# Altium footprint library SMD Component.PcbLib: 161 footprints (part 4 of 11)
Each footprint in its own frame and in the unit in brackets; x right, y up, seen from the top. Pads: shape width x height; smd on the part's side, far side on the other; paste and mask are expansions set on the pad; w line width, h text height; cw(c..) or ccw(c..) is an arc to the next point about the centre after c.
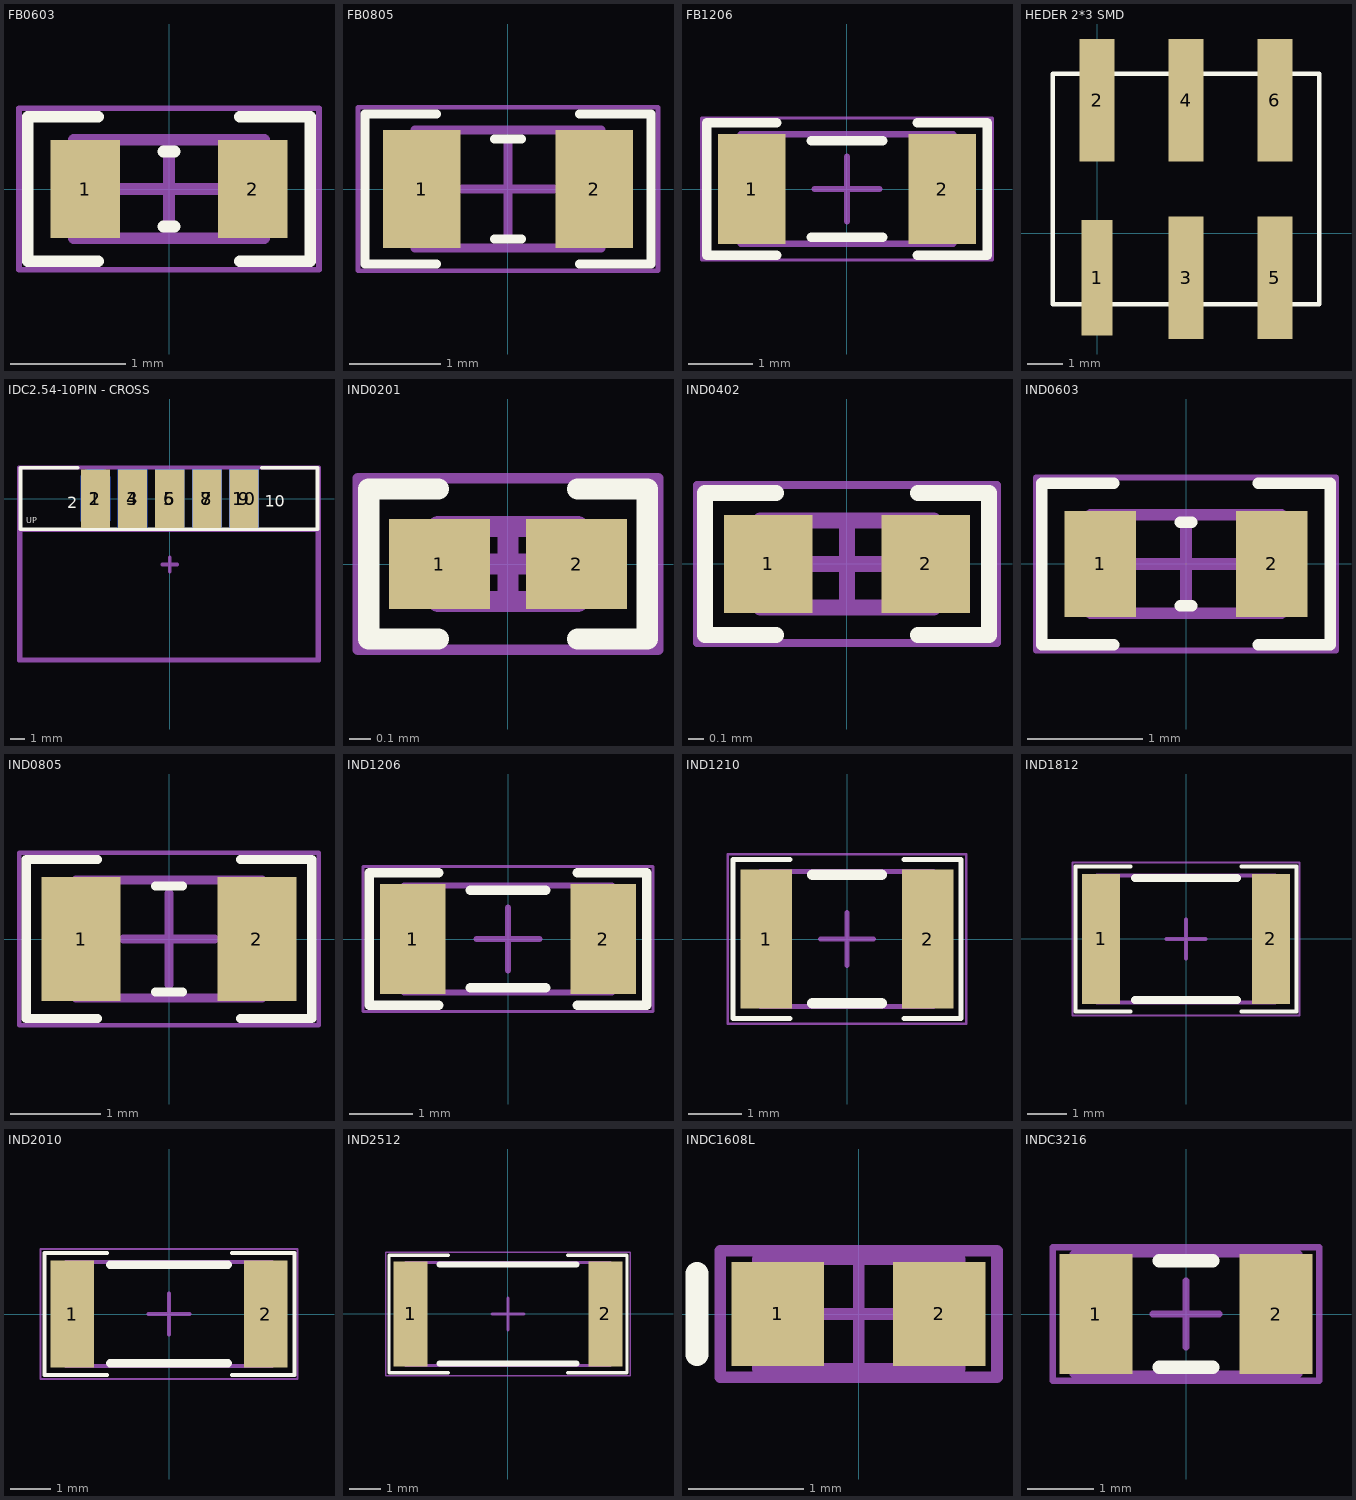
[diagram p3: the footprints below, top view; thin cyan lines are the x and y axes]

## FB0603 [mm] "Ferrite Chip Bead SMD 0603-Design:Ali Hafizi"
pads (2):
  rect 0.6x0.85 smd: 1(-0.725,0) 2(0.725,0)
Top Overlay:
  lines w0.1: -0.613,-0.625 -1.225,-0.625 -1.225,0.625 -0.613,0.625 ; -0.05,-0.325 0.05,-0.325 ; -0.05,0.325 0.05,0.325 ; 0.613,-0.625 1.225,-0.625 1.225,0.625 0.613,0.625
Mechanical 13:
  lines w0.1: -0.825,-0.425 -0.825,0.425 0.825,0.425 0.825,-0.425 -0.825,-0.425
Mechanical 15:
  lines w0.05: -1.3,-0.7 -1.3,0.7 1.3,0.7 1.3,-0.7 -1.3,-0.7
  lines w0.1: -0.425,0 0.425,0 ; 0,-0.425 0,0.425
3D body "User Library-FB_1608-1.STEP": height 0.8, standoff 0, extent -0.81,-0.4 0.79,0.4

## FB0805 [mm] "Ferrite Chip Bead SMD 0805-Design:Ali Hafizi"
pads (2):
  rect 0.85x1.3 smd: 1(-0.95,0) 2(0.95,0)
Top Overlay:
  lines w0.1: -0.787,-0.825 -1.575,-0.825 -1.575,0.825 -0.787,0.825 ; -0.15,-0.55 0.15,-0.55 ; -0.15,0.55 0.15,0.55 ; 0.788,-0.825 1.575,-0.825 1.575,0.825 0.788,0.825
Mechanical 13:
  lines w0.1: -1.025,-0.65 1.025,-0.65 1.025,0.65 -1.025,0.65 -1.025,-0.65
Mechanical 15:
  lines w0.05: -1.65,-0.9 1.65,-0.9 1.65,0.9 -1.65,0.9 -1.65,-0.9
  lines w0.1: -0.5,0 0.5,0 ; 0,-0.5 0,0.5
3D body "User Library-FB_2012-1.STEP": height 0.85, standoff 0, extent -1,-0.63 1,0.62

## FB1206 [mm] "Ferrite Chip Bead SMD 1206-Design:Ali Hafizi"
pads (2):
  rect 1.05x1.7 smd: 1(-1.475,0) 2(1.475,0)
Top Overlay:
  lines w0.15: -1.087,-1.025 -2.175,-1.025 -2.175,1.025 -1.087,1.025 ; -0.55,-0.75 0.55,-0.75 ; -0.55,0.75 0.55,0.75 ; 1.088,-1.025 2.175,-1.025 2.175,1.025 1.088,1.025
Mechanical 13:
  lines w0.1: -1.65,-0.85 -1.65,0.85 1.65,0.85 1.65,-0.85 -1.65,-0.85
Mechanical 15:
  lines w0.05: -2.25,-1.1 -2.25,1.1 2.25,1.1 2.25,-1.1 -2.25,-1.1
  lines w0.1: -0.5,0 0.5,0 ; 0,-0.5 0,0.5
3D body "User Library-ind_1206.step": height 1.1, standoff 0, extent -1.59,-0.8 1.61,0.8

## HEDER 2*3 SMD [mm]
pads (6):
  rect 0.889x3.302 smd: 1(0,-1.27)
  rect 1x3.5 smd: 2(0,3.81) 3(2.54,-1.27) 4(2.54,3.81) 5(5.08,-1.27) 6(5.08,3.81)
Top Overlay:
  lines w0.127: -1.27,-2.032 6.35,-2.032 6.35,4.572 -1.27,4.572 -1.27,-2.032

## IDC2.54-10PIN - CROSS [mm] "Connector; IDC, Low Profile Male Header, Thru-Hole; 10 Position; Vertical; Pitch 2.54 mm; 20.32 x 9.2 x 9.45 mm (LxWxH) DESIGNER : ABBAS BASEREH"
height 9.45
pads (10):
  rrect50% 2x4 smd far side: 1(-5.08,0)
  rect 2x4 smd: 2(-5.08,0) 4(-2.54,0) 6(0,0) 8(2.54,0) 10(5.08,0)
  rect 2x4 smd far side: 3(-2.54,0) 5(0,0) 7(2.54,0) 9(5.08,0)
Top Overlay:
  lines w0.254: -6.3,2.1 -10.2,2.1 -10.2,-2.1 10.1,-2.1 10.1,2.1 6.3,2.1
  text "2" at -7,-0.67 h0.8
  text "10" at 6.5,-0.57 h0.8
  text "UP" at -9.8,-1.7 h0.4
Bottom Overlay:
  text "1" at -6.6,-0.67 h0.8
  text "9" at 7.3,-0.57 h0.8
Mechanical 13:
  lines w0.254: -10.2,-11 10.1,-11 10.1,-2.17 -10.1,-2.17 -10.2,-2.17 -10.2,-11
  text "PCB EDGE" at -9.6,-1.87 h0.4
  text "SOCKET PLACE" at -2.4,-6.6 h0.4
Mechanical 15:
  lines w0.254: -0.5,-4.5 0.5,-4.5 ; 0,-5 0,-4 ; -10.3,-11.07 10.2,-11.07 10.2,2.13 -10.3,2.13 -10.3,-11.07
3D body "User Library-IDC Socket Male 10pin Straight THT Goldplated 2_54mm.STEP": height 4.27, standoff -4.58, extent -10.15,-10.97 10.15,1.43

## IND0201 [mm] "Chip Inductor, 2-Leads, Body 0/60x0/30mm, IPC Medium Density DESIGNER:ABBAS BASEREH"
height 0.23
pads (2):
  rect 0.47x0.42 smd mask+0.04: 1(-0.32,0) 2(0.32,0)
Top Overlay:
  lines w0.1: -0.325,-0.35 -0.65,-0.35 -0.65,0.35 -0.325,0.35 ; 0.325,-0.35 0.65,-0.35 0.65,0.35 0.325,0.35
Mechanical 13:
  lines w0.1: -0.325,-0.175 0.325,-0.175 0.325,0.175 -0.325,0.175 -0.325,-0.175
Mechanical 15:
  lines w0.05: -0.7,-0.4 0.7,-0.4 0.7,0.4 -0.7,0.4 -0.7,-0.4
  lines w0.1: -0.175,0 0.175,0 ; 0,-0.175 0,0.175
3D body "IND0201.step": height 0.23, standoff 0, extent -0.325,-0.175 0.325,0.175

## IND0402 [mm] "Chip Inductor, 2-Leads, Body 1/00x0/50mm, IPC Medium Density DESIGNER:ABBAS BASEREH"
height 0.32
pads (2):
  rect 0.56x0.62 smd mask+0.06: 1(-0.5,0) 2(0.5,0)
Top Overlay:
  lines w0.1: -0.45,-0.45 -0.9,-0.45 -0.9,0.45 -0.45,0.45 ; 0.45,-0.45 0.9,-0.45 0.9,0.45 0.45,0.45
Mechanical 13:
  lines w0.1: -0.55,-0.275 0.55,-0.275 0.55,0.275 -0.55,0.275 -0.55,-0.275
Mechanical 15:
  lines w0.05: -0.95,-0.5 0.95,-0.5 0.95,0.5 -0.95,0.5 -0.95,-0.5
  lines w0.1: -0.275,0 0.275,0 ; 0,-0.275 0,0.275
3D body "IND0402.step": height 0.32, standoff 0, extent -0.55,-0.275 0.55,0.275

## IND0603 [mm] "Chip Inductor, 2-Leads, Body 1/60x0/80mm, IPC Medium Density DESIGNER:ABBAS BASEREH"
height 0.4
pads (2):
  rect 0.62x0.92 smd: 1(-0.745,0) 2(0.745,0)
Top Overlay:
  lines w0.1: -0.625,-0.7 -1.25,-0.7 -1.25,0.7 -0.625,0.7 ; -0.05,-0.36 0.05,-0.36 ; -0.05,0.36 0.05,0.36 ; 0.625,-0.7 1.25,-0.7 1.25,0.7 0.625,0.7
Mechanical 13:
  lines w0.1: -0.825,-0.425 0.825,-0.425 0.825,0.425 -0.825,0.425 -0.825,-0.425
Mechanical 15:
  lines w0.05: -1.3,-0.75 1.3,-0.75 1.3,0.75 -1.3,0.75 -1.3,-0.75
  lines w0.1: -0.425,0 0.425,0 ; 0,-0.425 0,0.425
3D body "IND0603.step": height 0.4, standoff 0, extent -0.825,-0.425 0.825,0.425

## IND0805 [mm] "Chip Inductor, 2-Leads, Body 2/00x1/25mm, IPC Medium Density DESIGNER:ABBAS BASEREH"
height 0.5
pads (2):
  rect 0.87x1.37 smd: 1(-0.97,0) 2(0.97,0)
Top Overlay:
  lines w0.1: -0.788,-0.875 -1.575,-0.875 -1.575,0.875 -0.788,0.875 ; -0.15,-0.585 0.15,-0.585 ; -0.15,0.585 0.15,0.585 ; 0.788,-0.875 1.575,-0.875 1.575,0.875 0.788,0.875
Mechanical 13:
  lines w0.1: -1.025,-0.65 -1.025,0.65 1.025,0.65 1.025,-0.65 -1.025,-0.65
Mechanical 15:
  lines w0.05: -1.65,-0.95 -1.65,0.95 1.65,0.95 1.65,-0.95 -1.65,-0.95
  lines w0.1: -0.5,0 0.5,0 ; 0,-0.5 0,0.5
3D body "IND0805.step": height 0.5, standoff 0, extent -1.025,-0.65 1.025,0.65

## IND1206 [mm] "Chip Inductor, 2-Leads, Body 3/20x1/60mm, IPC Medium Density DESIGNER:ABBAS BASEREH"
height 0.94
pads (2):
  rect 1.04x1.74 smd: 1(-1.51,0) 2(1.51,0)
Top Overlay:
  lines w0.15: -1.1,-1.05 -2.2,-1.05 -2.2,1.05 -1.1,1.05 ; -0.6,-0.77 0.6,-0.77 ; -0.6,0.77 0.6,0.77 ; 1.1,-1.05 2.2,-1.05 2.2,1.05 1.1,1.05
Mechanical 13:
  lines w0.1: -1.65,-0.85 1.65,-0.85 1.65,0.85 -1.65,0.85 -1.65,-0.85
Mechanical 15:
  lines w0.05: -2.3,-1.15 2.3,-1.15 2.3,1.15 -2.3,1.15 -2.3,-1.15
  lines w0.1: -0.5,0 0.5,0 ; 0,-0.5 0,0.5
3D body "IND1206.step": height 0.94, standoff 0, extent -1.65,-0.85 1.65,0.85

## IND1210 [mm] "Chip Inductor, 2-Leads, Body 3/20x2/50mm, IPC Medium Density DESIGNER:ABBAS BASEREH"
height 0.55
pads (2):
  rect 0.97x2.62 smd: 1(-1.52,0) 2(1.52,0)
Top Overlay:
  lines w0.1: -1.075,-1.5 -2.15,-1.5 -2.15,1.5 -1.075,1.5 ; 1.075,-1.5 2.15,-1.5 2.15,1.5 1.075,1.5
  lines w0.2: -0.65,-1.21 0.65,-1.21 ; -0.65,1.21 0.65,1.21
Mechanical 13:
  lines w0.1: -1.625,-1.275 1.625,-1.275 1.625,1.275 -1.625,1.275 -1.625,-1.275
Mechanical 15:
  lines w0.05: -2.25,-1.6 2.25,-1.6 2.25,1.6 -2.25,1.6 -2.25,-1.6
  lines w0.1: -0.5,0 0.5,0 ; 0,-0.5 0,0.5
3D body "IND1210.step": height 0.55, standoff 0, extent -1.625,-1.275 1.625,1.275

## IND1812 [mm] "Chip Inductor, 2-Leads, Body 4/50x3/20mm, IPC Medium Density DESIGNER:ABBAS BASEREH"
height 0.55
pads (2):
  rect 0.97x3.32 smd: 1(-2.17,0) 2(2.17,0)
Top Overlay:
  lines w0.1: -1.413,-1.85 -2.825,-1.85 -2.825,1.85 -1.413,1.85 ; 1.413,-1.85 2.825,-1.85 2.825,1.85 1.413,1.85
  lines w0.2: -1.3,-1.56 1.3,-1.56 ; -1.3,1.56 1.3,1.56
Mechanical 13:
  lines w0.1: -2.275,-1.625 2.275,-1.625 2.275,1.625 -2.275,1.625 -2.275,-1.625
Mechanical 15:
  lines w0.05: -2.9,-1.95 2.9,-1.95 2.9,1.95 -2.9,1.95 -2.9,-1.95
  lines w0.1: -0.5,0 0.5,0 ; 0,-0.5 0,0.5
3D body "IND1812.step": height 0.55, standoff 0, extent -2.275,-1.625 2.275,1.625

## IND2010 [mm] "Chip Inductor, 2-Leads, Body 5/00x2/50mm, IPC Medium Density DESIGNER:ABBAS BASEREH"
height 0.55
pads (2):
  rect 1.07x2.62 smd: 1(-2.37,0) 2(2.37,0)
Top Overlay:
  lines w0.1: -1.519,-1.5 -3.05,-1.5 -3.05,1.5 -1.519,1.5 ; 1.544,-1.5 3.075,-1.5 3.075,1.5 1.544,1.5
  lines w0.2: -1.45,-1.21 1.45,-1.21 ; -1.45,1.21 1.45,1.21
Mechanical 13:
  lines w0.1: -2.525,-1.275 2.525,-1.275 2.525,1.275 -2.525,1.275 -2.525,-1.275
Mechanical 15:
  lines w0.05: -3.15,-1.6 3.15,-1.6 3.15,1.6 -3.15,1.6 -3.15,-1.6
  lines w0.1: -0.5,0 0.5,0 ; 0,-0.5 0,0.5
3D body "IND2010.step": height 0.55, standoff 0, extent -2.525,-1.275 2.525,1.275

## IND2512 [mm] "Chip Inductor, 2-Leads, Body 6/40x3/20mm, IPC Medium Density DESIGNER:ABBAS BASEREH"
height 0.7
pads (2):
  rect 1.07x3.32 smd: 1(-3.07,0) 2(3.07,0)
Top Overlay:
  lines w0.1: -1.875,-1.85 -3.75,-1.85 -3.75,1.85 -1.875,1.85 ; 1.875,-1.85 3.75,-1.85 3.75,1.85 1.875,1.85
  lines w0.2: -2.15,-1.56 2.15,-1.56 ; -2.15,1.56 2.15,1.56
Mechanical 13:
  lines w0.1: -3.225,-1.625 3.225,-1.625 3.225,1.625 -3.225,1.625 -3.225,-1.625
Mechanical 15:
  lines w0.05: -3.85,-1.95 3.85,-1.95 3.85,1.95 -3.85,1.95 -3.85,-1.95
  lines w0.1: -0.5,0 0.5,0 ; 0,-0.5 0,0.5
3D body "IND2512.step": height 0.7, standoff 0, extent -3.225,-1.625 3.225,1.625

## INDC1608L [mm] "Chip Inductor, Body 1.6x0.8mm, IPC High Density"
height 0.55
pads (2):
  rect 0.8x0.9 smd: 1(-0.7,0) 2(0.7,0)
Top Overlay:
  lines w0.2: -1.4,-0.35 -1.4,0.35
Mechanical 13:
  lines w0.1: -0.875,-0.475 -0.875,0.475 0.875,0.475 0.875,-0.475 -0.875,-0.475
Mechanical 15:
  lines w0.1: -0.475,0 0.475,0 ; 0,-0.475 0,0.475 ; -1.2,-0.55 -1.2,0.55 1.2,0.55 1.2,-0.55 -1.2,-0.55
3D body "INDC1608X95N.STEP": height 0.95, standoff 0, extent -0.8,-0.4 0.8,0.4

## INDC3216 [mm] "Chip Inductor, Body 3.2x1.6mm, IPC High Density"
height 0.55
pads (2):
  rect 1.1x1.8 smd: 1(-1.35,0) 2(1.35,0)
Top Overlay:
  lines w0.2: -0.4,-0.8 0.4,-0.8 ; -0.4,0.8 0.4,0.8
Mechanical 13:
  lines w0.1: -1.7,-0.9 -1.7,0.9 1.7,0.9 1.7,-0.9 -1.7,-0.9
Mechanical 15:
  lines w0.1: -0.5,0 0.5,0 ; 0,-0.5 0,0.5 ; -2,-1 -2,1 2,1 2,-1 -2,-1